# Altium footprint library TarabusLib_KOR.PcbLib: 560 footprints (part 17 of 35)
Each footprint in its own frame and in the unit in brackets; x right, y up, seen from the top. Pads: shape width x height; smd on the part's side, far side on the other; paste and mask are expansions set on the pad; w line width, h text height; cw(c..) or ccw(c..) is an arc to the next point about the centre after c.
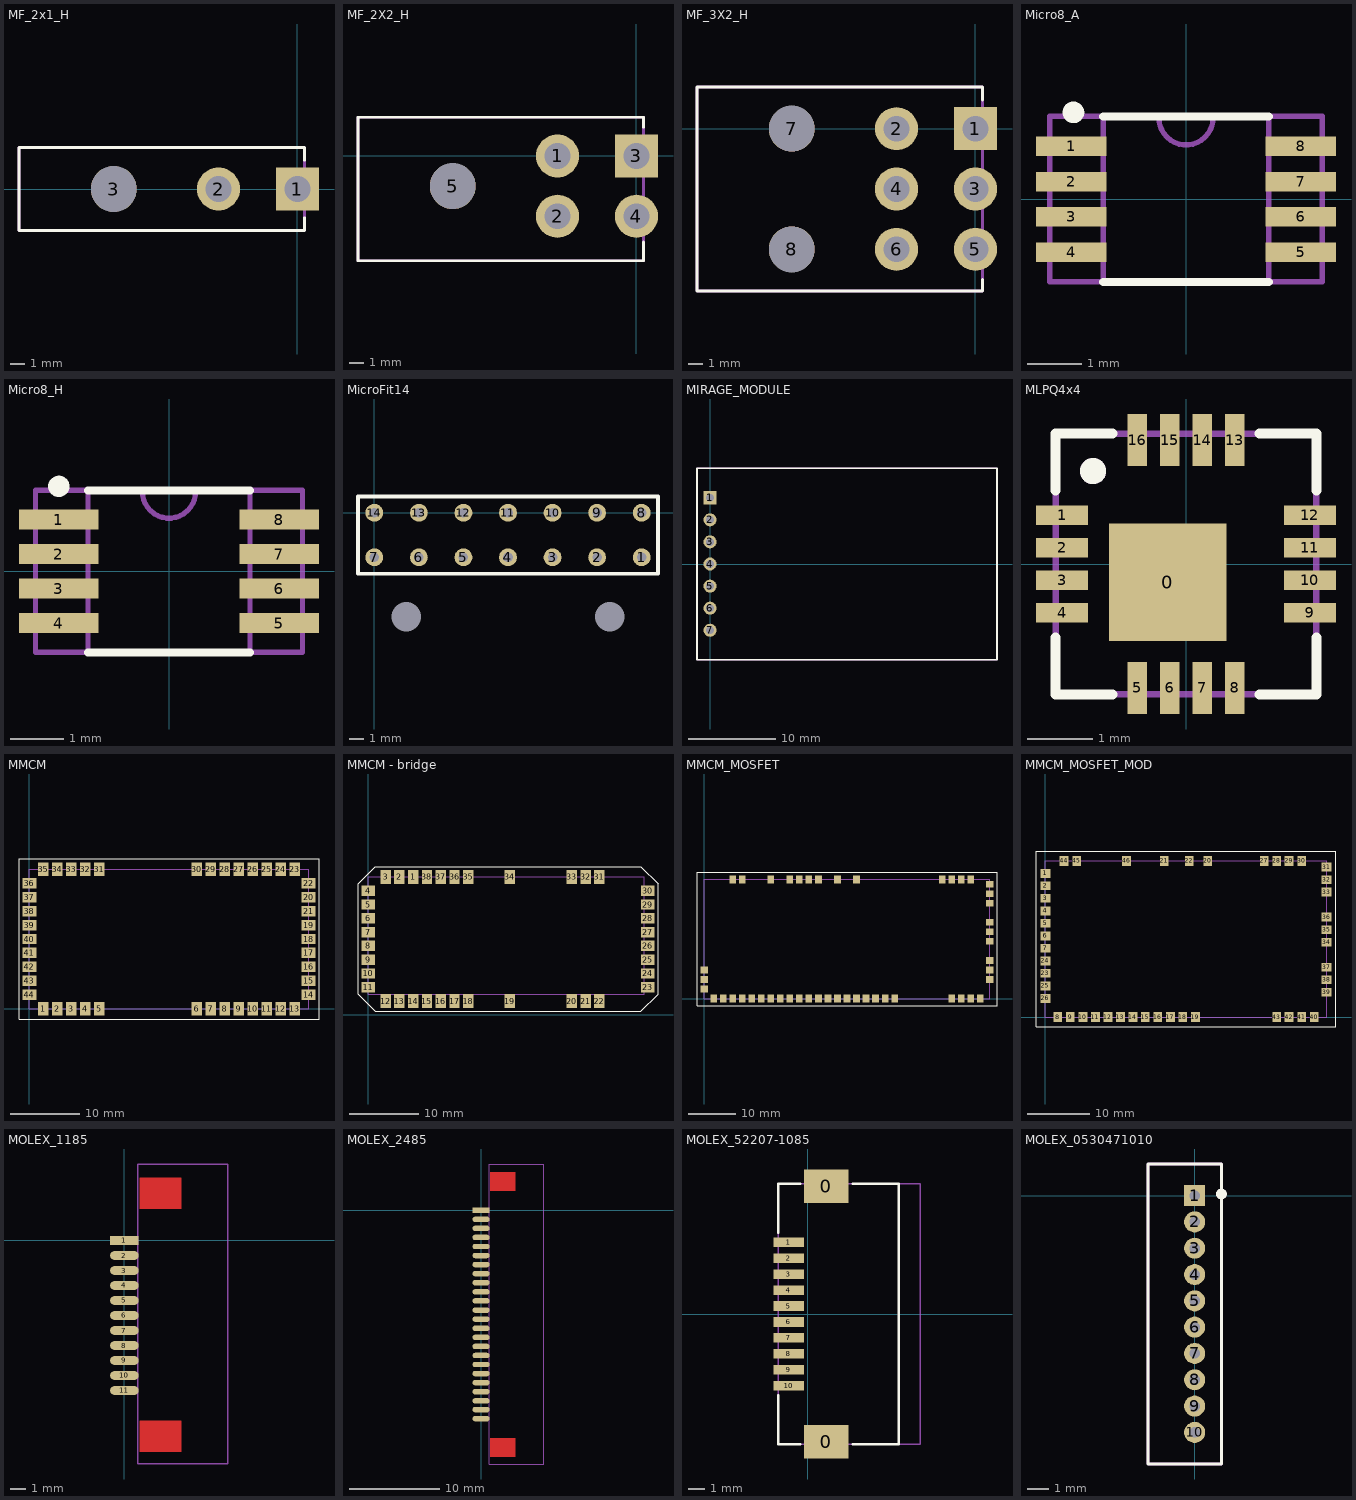
[diagram p16: the footprints below, top view; thin cyan lines are the x and y axes]

## MF_2x1_H [mm]
pads (3):
  rect 3x3 hole 1.8 mask+0: 1(0,0)
  round 3 hole 1.8 mask+0: 2(-5.5,0)
  round 3.2 hole 3.2 mask+0: 3(-12.8,0)
Top Overlay:
  lines w0.2: 0.5,-2 0.5,-2.9 -19.4,-2.9 -19.4,2.9 0.5,2.9 0.5,2
Mechanical 9:
  text ".Comment" at -2,-3.6 h0.6
  text ".Designator" at -2.67,3.04 h0.8
Mechanical 11:
  lines w0.2: -19.4,-2.9 -19.4,2.9 0.5,2.9 0.5,-2.9 -19.4,-2.9
3D body "026013101.stp": height 11.4, standoff -3.6, extent -19.435,-2.9 0.5,2.9

## MF_2X2_H [mm]
pads (5):
  round 3 hole 1.8 mask+0: 1(-5.5,0) 2(-5.5,-4.2) 4(0,-4.2)
  rect 3x3 hole 1.8 mask+0: 3(0,0)
  round 3.2 hole 3.2 mask+0: 5(-12.8,-2.1)
Top Overlay:
  lines w0.2: 0.5,-6 0.5,-7.3 -19.4,-7.3 -19.4,2.7 0.5,2.7 0.5,2
Mechanical 7:
  lines w0.2: -19.4,-7.3 -19.4,2.7 0.5,2.7 0.5,-7.3 -19.4,-7.3
Mechanical 10:
  text ".Comment" at -3.55,-0.65 h1
  text ".Designator" at -2.8,-0.65 h1
3D body "026013115.stp": height 11.4, standoff -3.6, extent -19.367,-7.3 0.567,2.7

## MF_3X2_H [mm]
pads (8):
  rect 3x3 hole 1.8 mask+0: 1(0,0)
  round 3 hole 1.8 mask+0: 2(-5.5,0) 3(0,-4.2) 4(-5.5,-4.2) 5(0,-8.4) 6(-5.5,-8.4)
  round 3.2 hole 3.2 mask+0: 7(-12.8,0) 8(-12.8,-8.4)
Top Overlay:
  lines w0.2: 0.5,-10.5 0.5,-11.3 -19.4,-11.3 -19.4,2.9 0.5,2.9 0.5,2
Mechanical 7:
  lines w0.2: -19.4,-11.3 -19.4,2.9 0.5,2.9 0.5,-11.3 -19.4,-11.3
Mechanical 10:
  text ".Designator" at -3.3,-3.1 h1
  text ".Comment" at -4.05,-3.1 h1
3D body "026013116.stp": height 11.4, standoff -3.6, extent -19.435,-11.3 0.5,2.9

## Micro8_A [mm]
height 1.11
pads (8):
  rect 1.3x0.36 smd: 1(-2.115,0.975) 2(-2.115,0.325) 3(-2.115,-0.325) 4(-2.115,-0.975) 5(2.115,-0.975) 6(2.115,-0.325) 7(2.115,0.325) 8(2.115,0.975)
Top Overlay:
  circle w0.2: c-2.075,1.6 r0.1
  lines w0.15: -1.525,-1.525 1.525,-1.525 ; -1.525,1.525 1.525,1.525
Mechanical 9:
  text ".Designator" at -0.67,2.04 h0.8
  text ".Comment" at -0.67,-2.26 h0.6
Mechanical 11:
  lines w0.1: -1.525,-1.525 -1.525,1.525 ; -0.499,1.525 ccw(c0,1.5) 0.499,1.525 ; 1.525,-1.525 1.525,1.525 ; -2.515,-1.525 2.515,-1.525 2.515,1.525 -2.515,1.525 -2.515,-1.525
3D body "User Library-msop-8.step": height 1.15, standoff 0, extent -2.425,-1.5 2.475,1.5

## Micro8_H [mm]
height 1.11
pads (8):
  rect 1.5x0.38 smd: 1(-2.075,0.975) 2(-2.075,0.325) 3(-2.075,-0.325) 4(-2.075,-0.975) 5(2.075,-0.975) 6(2.075,-0.325) 7(2.075,0.325) 8(2.075,0.975)
Top Overlay:
  circle w0.2: c-2.075,1.6 r0.1
  lines w0.15: -1.525,-1.525 1.525,-1.525 ; -1.525,1.525 1.525,1.525
Mechanical 7:
  lines w0.1: -1.525,-1.525 -1.525,1.525 ; -0.499,1.525 ccw(c0,1.5) 0.499,1.525 ; 1.525,-1.525 1.525,1.525 ; -2.515,-1.525 -2.515,1.525 2.515,1.525 2.515,-1.525 -2.515,-1.525
Mechanical 10:
  text ".Comment" at -0.67,-2.26 h0.6
  text ".Designator" at -0.67,2.04 h0.8
3D body: height 0.7, standoff 0, extent -2.515,-1.525 -1.525,1.525
3D body: height 0.7, standoff 0, extent 1.525,-1.525 2.515,1.525
3D body: height 1.11, standoff 0, extent -1.525,-1.525 1.525,1.525

## MicroFit14 [mm]
pads (16):
  round 1.2 hole 0.64: 1(18,-3) 2(15,-3) 3(12,-3) 4(9,-3) 5(6,-3) 6(3,-3) 7(0,-3) 8(18,0) 9(15,0) 10(12,0) 11(9,0) 12(6,0) 13(3,0) 14(0,0)
  round 0 hole 2: 5(2.15,-7) 5(15.85,-7)
Top Overlay:
  lines w0.254: -1.1,-4.1 -1.1,1.1 0.144,1.1 1.631,1.1 4.175,1.1 13.725,1.1 19.1,1.1 19.1,-4.1 -1.1,-4.1
3D body "430451400.stp": height 8.83, standoff -3.12, extent -3.575,-9.45 21.575,2.79

## MIRAGE_MODULE [mm]
pads (7):
  rect 1.5x1.5 hole 0.9: 1(0,7.62)
  round 1.5 hole 0.9: 2(0,5.08) 3(0,2.54) 4(0,0) 5(0,-2.54) 6(0,-5.08) 7(0,-7.62)
Top Overlay:
  lines w0.2: -1.5,-11 -1.5,11 33,11 33,-11 -1.5,-11
Mechanical 9:
  text ".Designator" at 10.33,4.04 h0.8
  text ".Comment" at 10.33,-0.26 h0.6
Mechanical 11:
  lines w0.2: -1.5,-11 33,-11 33,11 -1.5,11 -1.5,-11
3D body: height 5, standoff -3, extent -0.3,-7.94 0.3,-7.34
3D body: height 5, standoff -3, extent -0.3,-5.4 0.3,-4.8
3D body: height 5, standoff -3, extent -0.3,-2.86 0.3,-2.26
3D body: height 5, standoff -3, extent -0.3,-0.32 0.3,0.28
3D body: height 5, standoff -3, extent -0.3,2.22 0.3,2.82
3D body: height 5, standoff -3, extent -0.3,4.78 0.3,5.38
3D body: height 5, standoff -3, extent -0.3,7.3 0.3,7.9
3D body: height 7, standoff 3, extent 2,-11 33,11
3D body: height 4, standoff 3, extent -1.5,-11 2,11
3D body: height 3, standoff 0, extent -1.5,-11 2,11

## MLPQ4x4 [mm]
height 1
pads (17):
  rect 1.8x1.8 smd: 0(-0.28,-0.28)
  rect 0.8x0.3 smd: 1(-1.9,0.75) 2(-1.9,0.25) 3(-1.9,-0.25) 4(-1.9,-0.75) 9(1.9,-0.75) 10(1.9,-0.25) 11(1.9,0.25) 12(1.9,0.75)
  rect 0.3x0.8 smd: 5(-0.75,-1.9) 6(-0.25,-1.9) 7(0.25,-1.9) 8(0.75,-1.9) 13(0.75,1.9) 14(0.25,1.9) 15(-0.25,1.9) 16(-0.75,1.9)
Top Overlay:
  circle w0.2: c-1.425,1.425 r0.1
  lines w0.15: -2,-1.125 -2,-2 -1.125,-2 ; -2,1.125 -2,2 -1.125,2 ; 1.125,-2 2,-2 2,-1.125 ; 1.125,2 2,2 2,1.125
Mechanical 9:
  text ".Designator" at -1.05,3.425 h0.8
  text ".Comment" at -0.65,2.775 h0.6
Mechanical 11:
  circle w0.2: c-1.425,1.425 r0.1
  lines w0.1: -2,-2 2,-2 2,2 -2,2 -2,-2
3D body: height 1, standoff 0, extent -2,-2 2,2

## MMCM [mm]
height 4
pads (44):
  rect 1.5x2 smd mask+0.075: 1(2,0) 2(4,0) 3(6,0) 4(8,0) 5(10,0) 6(24,0) 7(26,0) 8(28,0) 9(30,0) 10(32,0) 11(34,0) 12(36,0) 13(38,0) 23(38,20) 24(36,20) 25(34,20) 26(32,20) 27(30,20) 28(28,20) 29(26,20) 30(24,20) 31(10,20) 32(8,20) 33(6,20) 34(4,20) 35(2,20)
  rect 2x1.5 smd mask+0.075: 14(40,2) 15(40,4) 16(40,6) 17(40,8) 18(40,10) 19(40,12) 20(40,16) 21(40,14) 22(40,18) 36(0,18) 37(0,16) 38(0,14) 39(0,12) 40(0,10) 41(0,8) 42(0,6) 43(0,4) 44(0,2)
Top Overlay:
  lines w0.1: -1.5,-1.5 -1.5,21.5 41.5,21.5 41.5,-1.5 -1.5,-1.5
Mechanical 7:
  lines w0.1: 0,0 40,0 40,20 0,20 0,0
Mechanical 10:
  text ".Designator" at 18.373,10 h1
  text ".Comment" at 18.373,13 h1
3D body "MMCM_V1.step": height 4.6, standoff 0.32, extent 0,0 40,20

## MMCM - bridge [mm]
height 4
pads (38):
  rect 1.5x2 smd mask+0.075: 1(6.5,20) 2(4.5,20) 3(2.5,20) 12(2.5,2) 13(4.5,2) 14(6.5,2) 15(8.5,2) 16(10.5,2) 17(12.5,2) 18(14.5,2) 19(20.5,2) 20(29.5,2) 21(31.5,2) 22(33.5,2) 31(33.5,20) 32(31.5,20) 33(29.5,20) 34(20.5,20) 35(14.5,20) 36(12.5,20) 37(10.5,20) 38(8.5,20)
  rect 2x1.5 smd mask+0.075: 4(0,18) 5(0,16) 6(0,14) 7(0,12) 8(0,10) 9(0,8) 10(0,6) 11(0,4) 23(40.5,4) 24(40.5,6) 25(40.5,8) 26(40.5,10) 27(40.5,12) 28(40.5,14) 29(40.5,16) 30(40.5,18)
Top Overlay:
  lines w0.1: -1.5,3 -1.5,19 1,21.5 39.5,21.5 42,19 42,3 39.5,0.5 1,0.5 -1.5,3
Mechanical 9:
  text ".Designator" at 18.373,10 h1
  text ".Comment" at 18.373,13 h1
Mechanical 11:
  lines w0.1: 0,3 40,3 40,20 0,20 0,3
3D body "MMCM_Bridge .step": height 2.7, standoff 0.25, extent 0,2 40.5,20

## MMCM_MOSFET [mm]
height 4
pads (49):
  rect 1.6x1.4 smd mask+0.075: 1(0,6) 2(0,4) 3(0,2) 27(60,4) 28(60,6) 29(60,8) 30(60,12) 31(60,14) 32(60,16) 33(60,20) 34(60,22) 35(60,24)
  rect 1.4x1.6 smd mask+0.075: 4(2,0) 5(4,0) 6(6,0) 7(8,0) 8(10,0) 9(12,0) 10(14,0) 11(16,0) 12(18,0) 13(20,0) 14(22,0) 15(24,0) 16(26,0) 17(28,0) 18(30,0) 19(32,0) 20(34,0) 21(36,0) 22(38,0) 22(40,0) 23(52,0) 24(54,0) 25(56,0) 26(58,0) 36(56,25) 37(54,25) 38(52,25) 39(50,25) 40(32,25) 41(28,25) 42(24,25) 43(22,25) 44(20,25) 45(18,25) 46(14,25) 47(8,25) 48(6,25)
Top Overlay:
  lines w0.1: -1.5,-1.5 -1.5,26.5 61.5,26.5 61.5,-1.5 -1.5,-1.5
Mechanical 7:
  lines w0.1: 0,0 60,0 60,25 0,25 0,0
Mechanical 10:
  text ".Designator" at 2,27.695 h1
  text ".Comment" at 8,27.695 h1
3D body "MMCM_MOSFET.step": height 3.6, standoff 0.03, extent 0,0 60,25

## MMCM_MOSFET_MOD [mm]
height 4
pads (46):
  rect 1.6x1.4 smd mask+0.075: 1(0,23) 2(0,21) 3(0,19) 4(0,17) 5(0,15) 6(0,13) 7(0,11) 23(0,7) 24(0,9) 25(0,5) 26(0,3) 31(45,24) 32(45,22) 33(45,20) 34(45,12) 35(45,14) 36(45,16) 37(45,8) 38(45,6) 39(45,4)
  rect 1.4x1.6 smd mask+0.075: 8(2,0) 9(4,0) 10(6,0) 11(8,0) 12(10,0) 13(12,0) 14(14,0) 15(16,0) 16(18,0) 17(20,0) 18(22,0) 19(24,0) 20(26,25) 21(19,25) 22(23,25) 27(35,25) 28(37,25) 29(39,25) 30(41,25) 40(43,0) 41(41,0) 42(39,0) 43(37,0) 44(3,25) 45(5,25) 46(13,25)
Top Overlay:
  lines w0.1: -1.5,-1.5 46.5,-1.5 46.5,26.5 -1.5,26.5 -1.5,-1.5
Mechanical 7:
  lines w0.1: 0,0 0,25 45,25 45,0 0,0
Mechanical 10:
  text ".Comment" at 26,28 h1
  text ".Designator" at 14,28 h1
3D body "КПТВ.Э11.030.06.01.00.step": height 2.3, standoff 0.33, extent 0,0 45,25

## MOLEX_1185 [mm]
pads (11):
  rect 1.9x0.6 smd: 1(0,0)
  oval 1.9x0.6 smd: 2(0,-1) 3(0,-2) 4(0,-3) 5(0,-4) 6(0,-5) 7(0,-6) 8(0,-7) 9(0,-8) 10(0,-9) 11(0,-10)
Top Layer:
  rectangle: 1,-14.108 3.8,-12.008
  rectangle: 1,2.1 3.8,4.2
Top Solder:
  rectangle: 0.9,-14.208 3.9,-11.908
  rectangle: 0.9,2 3.9,4.3
Mechanical 1:
  lines w0.1: 0.9,-14.9 6.9,-14.9 6.9,5.1 0.9,5.1 0.9,-14.9

## MOLEX_2485 [mm]
pads (24):
  rect 1.9x0.6 smd: 1(0,0)
  oval 1.9x0.6 smd: 2(0,-1) 3(0,-2) 4(0,-3) 5(0,-4) 6(0,-5) 7(0,-6) 8(0,-7) 9(0,-8) 10(0,-9) 11(0,-10) 12(0,-11.025) 13(0,-12.025) 14(0,-13.025) 15(0,-14.025) 16(0,-15.025) 17(0,-16.025) 18(0,-17.025) 19(0,-18.025) 20(0,-19.025) 21(0,-20.025) 22(0,-21.025) 23(0,-22) 24(0,-23)
Top Layer:
  rectangle: 1,-27.208 3.8,-25.108
  rectangle: 1,2.1 3.8,4.2
Top Solder:
  rectangle: 0.9,-27.308 3.9,-25.008
  rectangle: 0.9,2 3.9,4.3
Mechanical 1:
  lines w0.1: 0.9,-28 6.9,-28 6.9,5.1 0.9,5.1 0.9,-28

## MOLEX_52207-1085 [mm]
height 2.7
pads (12):
  rect 2.8x2.1 smd: 0(1.175,-8) 0(1.175,8)
  rect 1.9x0.6 smd: 1(-1.175,4.5) 2(-1.175,3.5) 3(-1.175,2.5) 4(-1.175,1.5) 5(-1.175,0.5) 6(-1.175,-0.5) 7(-1.175,-1.5) 8(-1.175,-2.5) 9(-1.175,-3.5) 10(-1.175,-4.5)
Top Overlay:
  lines w0.15: -1.825,-5.075 -1.825,-8.15 -0.45,-8.15 ; -1.825,5.075 -1.825,8.15 -0.45,8.15 ; 2.825,-8.15 5.725,-8.15 5.725,8.15 2.825,8.15
Mechanical 7:
  lines w0.1: -1.825,-8.15 -1.825,8.15 7.075,8.15 7.075,-8.15 -1.825,-8.15
Mechanical 10:
  text ".Designator" at 0.795,10.18 h0.8
  text ".Comment" at 0.805,9.61 h0.6
3D body "522071085.STEP": height 2.69, standoff -0.01, extent -1.825,-8.15 7.075,8.15

## MOLEX_0530471010 [mm]
pads (10):
  rect 1x1 hole 0.5 mask+0.15: 1(0,0)
  round 1 hole 0.5 mask+0.15: 2(0,-1.25) 3(0,-2.5) 4(0,-3.75) 5(0,-5) 6(0,-6.25) 7(0,-7.5) 8(0,-8.75) 9(0,-10) 10(0,-11.25)
Top Overlay:
  circle w0.254: c1.273,0.075 r0.127
  lines w0.15: -2.225,-12.75 1.275,-12.75 1.275,1.5 -2.225,1.5 -2.225,-12.75
Mechanical 7:
  lines w0.15: -2.225,-12.75 1.275,-12.75 1.275,1.5 -2.225,1.5 -2.225,-12.75
3D body "User Library-53047-1010.step": height 4.25, standoff -2.25, extent -2.225,-12.75 1.275,1.5